# Altium footprint library 7-Connectors-9.PcbLib: 41 footprints (part 2 of 3) (continued)
## MOLEX_52991-0308 [mm] "0.50mm Pitch SlimStack?Dual Row 30 Circuits Surface Mount Vertical Receptacle (3.00 and 4.00mm Stacking Heights)" (continued)
3D body "MOLEX_52991-0308.stp": height 2.32, standoff 0, extent -5.65,-2.7 5.65,2.7

## MOLEX_53748-0308 [mm] "0.50mm Pitch SlimStack Dual Row 30 Circuits Surface Mount Vertical Plug (3.00mm Stacking Heights)"
height 2.4
pads (30):
  rect 0.25x1.2 smd: 1(-3.5,1.7) 2(-3.5,-1.7) 3(-3,1.7) 4(-3,-1.7) 5(-2.5,1.7) 6(-2.5,-1.7) 7(-2,1.7) 8(-2,-1.7) 9(-1.5,1.7) 10(-1.5,-1.7) 11(-1,1.7) 12(-1,-1.7) 13(-0.5,1.7) 14(-0.5,-1.7) 15(0,1.7) 16(0,-1.7) 17(0.5,1.7) 18(0.5,-1.7) 19(1,1.7) 20(1,-1.7) 21(1.5,1.7) 22(1.5,-1.7) 23(2,1.7) 24(2,-1.7) 25(2.5,1.7) 26(2.5,-1.7) 27(3,1.7) 28(3,-1.7) 29(3.5,1.7) 30(3.5,-1.7)
Top Overlay:
  circle w0.25: c-5.644,2.286 r0.125
  lines w0.2: -5.65,-1.55 -4.025,-1.55 ; -5.65,-1.2 -4.75,-1.2 -4.75,1.2 -5.65,1.2 ; -5.65,1.55 -4.025,1.55 ; -5.37,-0.75 -5.37,-1.12 ; -5.37,0.75 -5.37,1.12 ; -5.25,-0.75 -5.25,-1 ; -5.25,0.75 -5.25,1 ; -4.95,-0.75 -5.65,-0.75 -5.65,-2.15 -4.55,-2.15 -4.55,-1.55 ; -4.95,0.75 -5.65,0.75 -5.65,1.66 -4.95,2.15 -4.55,2.15 -4.55,1.55 ; -4.35,-1.36 -4.2,-1.21 ; -4.35,1.36 -4.2,1.21 ; -4.16,-1.55 -4.01,-1.4 cw(c-4.014,-1.214) -4.2,-1.21 ; -4.16,1.55 -4.01,1.4 ccw(c-4.014,1.214) -4.2,1.21 ; -4.15,-1.55 cw(c-4.15,-1.35) -4.35,-1.35 -4.35,1.35 cw(c-4.15,1.35) -4.15,1.55 ; -3.87,-0.7 -3.87,0.7 ; 3.87,-0.7 3.87,0.7 ; 4.025,-1.55 5.65,-1.55 ; 4.025,1.55 5.65,1.55 ; 4.15,-1.55 ccw(c4.15,-1.35) 4.35,-1.36 ; 4.16,-1.55 4.01,-1.4 ccw(c4.014,-1.214) 4.2,-1.21 ; 4.35,1.359 ccw(c4.15,1.35) 4.16,1.55 4.01,1.4 cw(c4.014,1.214) 4.2,1.21 ; 4.55,1.55 4.55,2.15 5.65,2.15 5.65,0.75 4.95,0.75 ; 4.552,-1.55 4.55,-2.15 5.65,-2.15 5.65,-0.75 4.95,-0.75 ; 5.25,-0.75 5.25,-1 ; 5.25,0.75 5.25,1 ; 5.37,-0.75 5.37,-1.12 ; 5.37,0.75 5.37,1.12 ; 5.65,-1.2 4.75,-1.2 4.75,1.2 5.65,1.2 ; -5.37,-1.12 -4.83,-1.12 ; -5.37,-1.12 -5.25,-1 ; -5.37,1.12 -4.83,1.12 ; -5.37,1.12 -5.25,1 ; -5.25,-1 -4.95,-1 ; -5.25,1 -4.95,1 ; -4.95,-1 -4.95,1 ; -4.95,-1 -4.83,-1.12 ; -4.95,1 -4.83,1.12 ; -4.83,-1.12 -4.83,1.12 ; -4.2,-1.21 -4.2,1.21 ; 4.2,-1.21 4.35,-1.36 ; 4.2,-1.21 4.2,1.21 ; 4.2,1.21 4.35,1.36 4.35,-1.36 ; 4.83,-1.12 4.95,-1 ; 4.83,-1.12 5.37,-1.12 ; 4.83,-1.12 4.83,1.12 ; 4.83,1.12 5.37,1.12 ; 4.83,1.12 4.95,1 ; 4.95,-1 4.95,1 ; 4.95,-1 5.25,-1 ; 4.95,1 5.25,1 ; 5.25,-1 5.37,-1.12 ; 5.25,1 5.37,1.12
Mechanical 8:
  drawing of 184 lines, arcs and shapes, not listed
Mechanical 14:
  drawing of 354 lines, arcs and shapes, not listed
Mechanical 15:
  lines w0.05: -5.9,-2.55 -5.9,2.55 5.9,2.55 5.9,-2.55 -5.9,-2.55
3D body "MOLEX_53748-0308.stp": height 2.42, standoff 0, extent -5.65,-2.15 5.65,2.15

## MOLEX_87832-1420 [mm] "Milli-Grid, Pitch 2mm, 14 contacts, Surface Mount Vertical Header With Locking Window And Centre Polarization Slot"
height 6.4
pads (16):
  rect 1x2.75 smd: 1(-6,-2.125) 2(-6,2.125) 3(-4,-2.125) 4(-4,2.125) 5(-2,-2.125) 6(-2,2.125) 7(0,-2.125) 8(0,2.125) 9(2,-2.125) 10(2,2.125) 11(4,-2.125) 12(4,2.125) 13(6,-2.125) 14(6,2.125)
  round 0.5 hole 1 unplated: 15(-5,0) 16(5,0)
Top Overlay:
  lines w0.2: -8.325,-1.5 -7.675,-1.5 ; -8.325,0.5 -7.675,0.5 ; -6.8,-3.15 -8.325,-3.15 ; -6.8,-2.5 -7.675,-2.5 ; -6.8,2.5 -7.675,2.5 ; -6.8,3.15 -8.325,3.15 ; 6.8,-3.15 8.325,-3.15 ; 6.8,-2.5 7.675,-2.5 ; 6.8,2.5 7.675,2.5 ; 6.8,3.15 8.325,3.15 ; 7.675,-0.5 8.325,-0.5 ; 7.675,1.5 8.325,1.5 ; -8.325,-3.15 -8.325,3.15 ; -8.325,-3.15 -7.675,-2.5 ; -8.325,3.15 -7.675,2.5 ; -7.675,-2.5 -7.675,2.5 ; 7.675,-2.5 8.325,-3.15 ; 7.675,-2.5 8.325,-3.15 ; 7.675,-2.5 7.675,2.5 ; 7.675,2.5 8.325,3.15 ; 7.675,2.5 8.325,3.15 ; 8.325,-3.15 8.325,3.15 ; -6.5,-4.25 -6,-3.75 -5.5,-4.25 -6.5,-4.25
Mechanical 14:
  lines w0.1: -8.325,-1.5 -7.675,-1.5 ; -8.325,0.5 -7.675,0.5 ; 7.675,-0.5 8.325,-0.5 ; 7.675,1.5 8.325,1.5 ; -8.325,-3.15 8.325,-3.15 ; -8.325,-3.15 -7.675,-2.5 ; -8.325,-3.15 -8.325,3.15 ; -8.325,3.15 8.325,3.15 ; -8.325,3.15 -7.675,2.5 ; -7.675,-2.5 -7.675,2.5 ; -7.675,-2.5 7.675,-2.5 ; -7.675,2.5 7.675,2.5 ; 7.675,-2.5 7.675,2.5 ; 7.675,-2.5 8.325,-3.15 ; 7.675,-2.5 8.325,-3.15 ; 7.675,2.5 8.325,3.15 ; 7.675,2.5 8.325,3.15 ; 8.325,-3.15 8.325,3.15 ; -6.5,-4.25 -5.5,-4.25 -6,-3.75 -6.5,-4.25
Mechanical 15:
  lines w0.05: -8.575,-3.765 -8.575,3.765 8.575,3.765 8.575,-3.765 -8.575,-3.765
3D body "MOLEX_87832-1420.stp": height 7.6, standoff -1, extent -8.325,-3.15 8.325,3.15

## MTGP720H320V6P [mm]
pads (1):
  round 7.2 hole 3.25: 1(0,0)
via 2.2,-1.35 diameter 1 hole 0.5
via 0,-2.625 diameter 1 hole 0.5
via 2.2,1.35 diameter 1 hole 0.5
via 0,2.525 diameter 1 hole 0.5
via -2.2,1.375 diameter 1 hole 0.5
via -2.2,-1.35 diameter 1 hole 0.5
Mechanical 8:
  circle w0.1: c0,0 r3.75
  circle w0.1: c0,0 r2.6
  lines w0.1: -2.657,1.625 -2.224,1.375 ; -2.632,-1.6 -2.199,-1.35 ; -2.474,0.942 -2.224,1.375 ; -2.449,-0.917 -2.199,-1.35 ; -1.974,1.808 -2.224,1.375 ; -1.949,-1.783 -2.199,-1.35 ; -1.791,1.125 -2.224,1.375 ; -1.766,-1.1 -2.199,-1.35 ; -0.5,-2.625 0,-2.625 ; -0.5,0 0,0 ; -0.5,2.525 0,2.525 ; 0,-3.125 0,-2.625 ; 0,-2.125 0,-2.625 ; 0,-0.5 0,0 ; 0,0.5 0,0 ; 0,2.025 0,2.525 ; 0,3.025 0,2.525 ; 0.5,-2.625 0,-2.625 ; 0.5,0 0,0 ; 0.5,2.525 0,2.525 ; 1.766,-1.1 2.199,-1.35 ; 1.766,1.1 2.199,1.35 ; 1.949,-1.783 2.199,-1.35 ; 1.949,1.783 2.199,1.35 ; 2.449,-0.917 2.199,-1.35 ; 2.449,0.917 2.199,1.35 ; 2.632,-1.6 2.199,-1.35 ; 2.632,1.6 2.199,1.35
Mechanical 14:
  circle w0.1: c0,0 r3.75
Mechanical 15:
  circle w0.05: c0,0 r3.85
3D body "mtgp720h320v6p.stp": height 0.1, standoff -1.75, extent -3.627,-3.627 3.628,3.628

## PANASONIC_AXN350038S [mm] "50 Contacts, Narrow-Pitch 0.8mm, Surface Mount, Straight Board Stacking Connector, Socket P8 Serie"
height 2.2
pads (52):
  rect 0.5x1.53 smd: 1(9.6,2.425) 2(9.6,-2.425) 3(8.8,2.425) 4(8.8,-2.425) 5(8,2.425) 6(8,-2.425) 7(7.2,2.425) 8(7.2,-2.425) 9(6.4,2.425) 10(6.4,-2.425) 11(5.6,2.425) 12(5.6,-2.425) 13(4.8,2.425) 14(4.8,-2.425) 15(4,2.425) 16(4,-2.425) 17(3.2,2.425) 18(3.2,-2.425) 19(2.4,2.425) 20(2.4,-2.425) 21(1.6,2.425) 22(1.6,-2.425) 23(0.8,2.425) 24(0.8,-2.425) 25(0,2.425) 26(0,-2.425) 27(-0.8,2.425) 28(-0.8,-2.425) 29(-1.6,2.425) 30(-1.6,-2.425) 31(-2.4,2.425) 32(-2.4,-2.425) 33(-3.2,2.425) 34(-3.2,-2.425) 35(-4,2.425) 36(-4,-2.425) 37(-4.8,2.425) 38(-4.8,-2.425) 39(-5.6,2.425) 40(-5.6,-2.425) 41(-6.4,2.425) 42(-6.4,-2.425) 43(-7.2,2.425) 44(-7.2,-2.425) 45(-8,2.425) 46(-8,-2.425) 47(-8.8,2.425) 48(-8.8,-2.425) 49(-9.6,2.425) 50(-9.6,-2.425)
  round 0.5 hole 0.9 unplated: 51(10.75,-1.95) 52(-10.75,-1.95)
Top Overlay:
  drawing of 237 lines, arcs and shapes, not listed
Mechanical 8:
  drawing of 414 lines, arcs and shapes, not listed
Mechanical 14:
  drawing of 244 lines, arcs and shapes, not listed
Mechanical 15:
  lines w0.05: -11.95,-3.44 -11.95,3.44 11.95,3.44 11.95,-3.44 -11.95,-3.44
3D body "PANASONIC_AXN350038S.stp": height 2.2, standoff -0.4, extent -11.7,-2.94 11.7,2.94

## PB [mm]
Top Overlay:
  circle w0.5: c-0.031,0.013 r2.5
  lines w0.5: -1.737,1.719 1.675,-1.693
  text "Pb" at -1.536,-0.948 h3.05
3D body "pb.stp": height 0.02, standoff 0, extent -2.725,-2.725 2.725,2.725

## PCI EXPRESS X1 [mm] "36 contacts Board Eddge PCI Express x1 Connector"
height 0.91
pads (36):
  rect 0.7x3.2 smd far side paste-0.4: A1(0.65,4)
  rect 0.7x4 smd far side paste-0.4: A2(1.65,3.6) A3(2.65,3.6) A4(3.65,3.6) A5(4.65,3.6) A6(5.65,3.6) A7(6.65,3.6) A8(7.65,3.6) A9(8.65,3.6) A10(9.65,3.6) A11(10.65,3.6) A12(13.65,3.6) A13(14.65,3.6) A14(15.65,3.6) A15(16.65,3.6) A16(17.65,3.6) A17(18.65,3.6) A18(19.65,3.6)
  rect 0.7x4 smd paste-0.4: B1(0.65,3.6) B2(1.65,3.6) B3(2.65,3.6) B4(3.65,3.6) B5(4.65,3.6) B6(5.65,3.6) B7(6.65,3.6) B8(7.65,3.6) B9(8.65,3.6) B10(9.65,3.6) B11(10.65,3.6) B12(13.65,3.6) B13(14.65,3.6) B14(15.65,3.6) B15(16.65,3.6) B16(17.65,3.6) B18(19.65,3.6)
  rect 0.7x3.2 smd paste-0.4: B17(18.65,4)
Top Overlay:
  text "B1" at 0.889,6.096 h0.76
  text "B11" at 10.889,6.096 h0.76
  text "B12" at 13.989,6.096 h0.76
  text "B18" at 19.989,6.096 h0.76
Bottom Overlay:
  text "A1" at 0.051,6.02 h0.76
  text "A11" at 10.051,6.02 h0.76
  text "A12" at 13.151,6.02 h0.76
  text "A18" at 19.151,6.02 h0.76
Mechanical 8:
  drawing of 164 lines, arcs and shapes, not listed

## PCI EXPRESS X4 [mm] "64 contacts Board Eddge PCI Express x4 Connector"
height 0.91
pads (64):
  rect 0.7x3.2 smd far side paste-0.4: A1(0.65,4)
  rect 0.7x4 smd far side paste-0.4: A2(1.65,3.6) A3(2.65,3.6) A4(3.65,3.6) A5(4.65,3.6) A6(5.65,3.6) A7(6.65,3.6) A8(7.65,3.6) A9(8.65,3.6) A10(9.65,3.6) A11(10.65,3.6) A12(13.65,3.6) A13(14.65,3.6) A14(15.65,3.6) A15(16.65,3.6) A16(17.65,3.6) A17(18.65,3.6) A18(19.65,3.6) A19(20.65,3.6) A20(21.65,3.6) A21(22.65,3.6) A22(23.65,3.601) A23(24.65,3.601) A24(25.65,3.601) A25(26.65,3.601) A26(27.65,3.601) A27(28.65,3.601) A28(29.65,3.601) A29(30.65,3.602) A30(31.65,3.602) A31(32.65,3.602) A32(33.65,3.602)
  rect 0.7x4 smd paste-0.4: B1(0.65,3.6) B2(1.65,3.6) B3(2.65,3.6) B4(3.65,3.6) B5(4.65,3.6) B6(5.65,3.6) B7(6.65,3.6) B8(7.65,3.6) B9(8.65,3.6) B10(9.65,3.6) B11(10.65,3.6) B12(13.65,3.6) B13(14.65,3.6) B14(15.65,3.6) B15(16.65,3.6) B16(17.65,3.6) B18(19.65,3.6) B19(20.65,3.6) B20(21.65,3.6) B21(22.65,3.6) B22(23.65,3.601) B23(24.65,3.601) B24(25.65,3.601) B25(26.65,3.601) B26(27.65,3.601) B27(28.65,3.601) B28(29.65,3.601) B29(30.65,3.602) B30(31.65,3.602) B32(33.65,3.602)
  rect 0.7x3.2 smd paste-0.4: B17(18.65,4) B31(32.65,4.002)
Top Overlay:
  text "B32" at 33.989,6.098 h0.76
  text "B18" at 19.989,6.096 h0.76
  text "B12" at 13.989,6.096 h0.76
  text "B11" at 10.889,6.096 h0.76
  text "B1" at 0.889,6.096 h0.76
Bottom Overlay:
  text "A32" at 33.151,6.022 h0.76
  text "A18" at 19.151,6.02 h0.76
  text "A12" at 13.151,6.02 h0.76
  text "A11" at 10.051,6.02 h0.76
  text "A1" at 0.051,6.02 h0.76
Mechanical 8:
  drawing of 280 lines, arcs and shapes, not listed

## PCI EXPRESS X8 [mm] "98 contacts Board Eddge PCI Express x8 Connector"
height 0.91
pads (98):
  rect 0.7x3.2 smd far side paste-0.4: A1(0.65,4)
  rect 0.7x4 smd far side paste-0.4: A2(1.65,3.6) A3(2.65,3.6) A4(3.65,3.6) A5(4.65,3.6) A6(5.65,3.6) A7(6.65,3.6) A8(7.65,3.6) A9(8.65,3.6) A10(9.65,3.6) A11(10.65,3.6) A12(13.65,3.6) A13(14.65,3.6) A14(15.65,3.6) A15(16.65,3.6) A16(17.65,3.6) A17(18.65,3.6) A18(19.65,3.6) A19(20.65,3.6) A20(21.65,3.6) A21(22.65,3.6) A22(23.65,3.601) A23(24.65,3.601) A24(25.65,3.601) A25(26.65,3.601) A26(27.65,3.601) A27(28.65,3.601) A28(29.65,3.601) A29(30.65,3.602) A30(31.65,3.602) A31(32.65,3.602) A32(33.65,3.602) A33(34.65,3.602) A34(35.65,3.602) A35(36.65,3.602) A36(37.65,3.602) A37(38.65,3.602) A38(39.65,3.602) A39(40.65,3.602) A40(41.65,3.602) A41(42.65,3.602) A42(43.65,3.602) A43(44.65,3.602) A44(45.65,3.602) A45(46.65,3.602) A46(47.65,3.602) A47(48.65,3.602) A48(49.65,3.602) A49(50.65,3.602)
  rect 0.7x4 smd paste-0.4: B1(0.65,3.6) B2(1.65,3.6) B3(2.65,3.6) B4(3.65,3.6) B5(4.65,3.6) B6(5.65,3.6) B7(6.65,3.6) B8(7.65,3.6) B9(8.65,3.6) B10(9.65,3.6) B11(10.65,3.6) B12(13.65,3.6) B13(14.65,3.6) B14(15.65,3.6) B15(16.65,3.6) B16(17.65,3.6) B18(19.65,3.6) B19(20.65,3.6) B20(21.65,3.6) B21(22.65,3.6) B22(23.65,3.601) B23(24.65,3.601) B24(25.65,3.601) B25(26.65,3.601) B26(27.65,3.601) B27(28.65,3.601) B28(29.65,3.601) B29(30.65,3.602) B30(31.65,3.602) B32(33.65,3.602) B33(34.65,3.602) B34(35.65,3.602) B35(36.65,3.602) B36(37.65,3.602) B37(38.65,3.602) B38(39.65,3.602) B39(40.65,3.602) B40(41.65,3.602) B41(42.65,3.602) B42(43.65,3.602) B43(44.65,3.602) B44(45.65,3.602) B45(46.65,3.602) B46(47.65,3.602) B47(48.65,3.602) B49(50.65,3.602)
  rect 0.7x3.2 smd paste-0.4: B17(18.65,4) B31(32.65,4.002) B48(49.65,4.002)
Top Overlay:
  text "B1" at 0.889,6.096 h0.76
  text "B11" at 10.889,6.096 h0.76
  text "B12" at 13.989,6.096 h0.76
  text "B18" at 19.989,6.096 h0.76
  text "B32" at 33.989,6.098 h0.76
  text "B49" at 50.989,6.098 h0.76
Bottom Overlay:
  text "A1" at 0.051,6.02 h0.76
  text "A11" at 10.051,6.02 h0.76
  text "A12" at 13.151,6.02 h0.76
  text "A18" at 19.151,6.02 h0.76
  text "A32" at 33.151,6.022 h0.76
  text "A49" at 50.151,6.022 h0.76
Mechanical 8:
  drawing of 308 lines, arcs and shapes, not listed

## PCI EXPRESS X16 [mm] "164 contacts Board Eddge PCI Express x16 Connector"
height 0.91
pads (164):
  rect 0.7x3.2 smd far side paste-0.4: A1(0.65,4)
  rect 0.7x4 smd far side paste-0.4: A2(1.65,3.6) A3(2.65,3.6) A4(3.65,3.6) A5(4.65,3.6) A6(5.65,3.6) A7(6.65,3.6) A8(7.65,3.6) A9(8.65,3.6) A10(9.65,3.6) A11(10.65,3.6) A12(13.65,3.6) A13(14.65,3.6) A14(15.65,3.6) A15(16.65,3.6) A16(17.65,3.6) A17(18.65,3.6) A18(19.65,3.6) A19(20.65,3.6) A20(21.65,3.6) A21(22.65,3.6) A22(23.65,3.601) A23(24.65,3.601) A24(25.65,3.601) A25(26.65,3.601) A26(27.65,3.601) A27(28.65,3.601) A28(29.65,3.601) A29(30.65,3.602) A30(31.65,3.602) A31(32.65,3.602) A32(33.65,3.602) A33(34.65,3.602) A34(35.65,3.602) A35(36.65,3.602) A36(37.65,3.602) A37(38.65,3.602) A38(39.65,3.602) A39(40.65,3.602) A40(41.65,3.602) A41(42.65,3.602) A42(43.65,3.602) A43(44.65,3.602) A44(45.65,3.602) A45(46.65,3.602) A46(47.65,3.602) A47(48.65,3.602) A48(49.65,3.602) A49(50.65,3.602) A50(51.65,3.602) A51(52.65,3.602) A52(53.65,3.602) A53(54.65,3.602) A54(55.65,3.602) A55(56.65,3.602) A56(57.65,3.602) A57(58.65,3.602) A58(59.65,3.602) A59(60.65,3.602) A60(61.65,3.602) A61(62.65,3.602) A62(63.65,3.602) A63(64.65,3.602) A64(65.65,3.602) A65(66.65,3.602) A66(67.65,3.602) A67(68.65,3.602) A68(69.65,3.602) A69(70.65,3.602) A70(71.65,3.602) A71(72.65,3.602) A72(73.65,3.602) A73(74.65,3.602) A74(75.65,3.602) A75(76.65,3.602) A76(77.65,3.602) A77(78.65,3.602) A78(79.65,3.602) A79(80.65,3.602) A80(81.65,3.602) A81(82.65,3.602) A82(83.65,3.602)
  rect 0.7x4 smd paste-0.4: B1(0.65,3.6) B2(1.65,3.6) B3(2.65,3.6) B4(3.65,3.6) B5(4.65,3.6) B6(5.65,3.6) B7(6.65,3.6) B8(7.65,3.6) B9(8.65,3.6) B10(9.65,3.6) B11(10.65,3.6) B12(13.65,3.6) B13(14.65,3.6) B14(15.65,3.6) B15(16.65,3.6) B16(17.65,3.6) B18(19.65,3.6) B19(20.65,3.6) B20(21.65,3.6) B21(22.65,3.6) B22(23.65,3.601) B23(24.65,3.601) B24(25.65,3.601) B25(26.65,3.601) B26(27.65,3.601) B27(28.65,3.601) B28(29.65,3.601) B29(30.65,3.602) B30(31.65,3.602) B32(33.65,3.602) B33(34.65,3.602) B34(35.65,3.602) B35(36.65,3.602) B36(37.65,3.602) B37(38.65,3.602) B38(39.65,3.602) B39(40.65,3.602) B40(41.65,3.602) B41(42.65,3.602) B42(43.65,3.602) B43(44.65,3.602) B44(45.65,3.602) B45(46.65,3.602) B46(47.65,3.602) B47(48.65,3.602) B49(50.65,3.602) B50(51.65,3.602) B51(52.65,3.602) B52(53.65,3.602) B53(54.65,3.602) B54(55.65,3.602) B55(56.65,3.602) B56(57.65,3.602) B57(58.65,3.602) B58(59.65,3.602) B59(60.65,3.602) B60(61.65,3.602) B61(62.65,3.602) B62(63.65,3.602) B63(64.65,3.602) B64(65.65,3.602) B65(66.65,3.602) B66(67.65,3.602) B67(68.65,3.602) B68(69.65,3.602) B69(70.65,3.602) B70(71.65,3.602) B71(72.65,3.602) B72(73.65,3.602) B73(74.65,3.602) B74(75.65,3.602) B75(76.65,3.602) B76(77.65,3.602) B77(78.65,3.602) B78(79.65,3.602) B79(80.65,3.602) B80(81.65,3.602) B82(83.65,3.602)
  rect 0.7x3.2 smd paste-0.4: B17(18.65,4) B31(32.65,4.002) B48(49.65,4.002) B81(82.65,4.002)
Top Overlay:
  text "B1" at 0.889,6.096 h0.76
  text "B11" at 10.889,6.096 h0.76
  text "B12" at 13.989,6.096 h0.76
  text "B18" at 19.989,6.096 h0.76
  text "B32" at 33.989,6.098 h0.76
  text "B49" at 50.989,6.098 h0.76
  text "B82" at 83.989,6.098 h0.76
Bottom Overlay:
  text "A1" at 0.051,6.02 h0.76
  text "A11" at 10.051,6.02 h0.76
  text "A12" at 13.151,6.02 h0.76
  text "A18" at 19.151,6.02 h0.76
  text "A32" at 33.151,6.022 h0.76
  text "A49" at 50.151,6.022 h0.76
  text "A82" at 83.151,6.022 h0.76
Mechanical 8:
  drawing of 328 lines, arcs and shapes, not listed

## PIC-SMT-4 [mm]
height 16.45
pads (6):
  rect 0.5x1.6 smd mask+0.051: 1(1.778,1.168) 2(0.508,1.168)
  rect 0.5x1.6 smd mask+0: 3(-0.635,1.168) 4(-1.905,1.168)
  rect 2x2 smd mask+0: 5(-4.445,-1.168) 6(4.445,-1.168)
Top Overlay:
  lines w0.254: -5.029,-2.413 -5.029,0.787 -4.75,0.787 4.826,0.787 4.826,-2.413 -5.029,-2.413
3D body "pic-smt-4.stp": height 2.6, standoff 0, extent -4.925,-2.54 4.875,1.46

## SAMTEC_CLM-107-02-L-D-PA-TR [mm] "14 Contacts - Pitch 1mm - Dual Row Surface Mount Straight Strip Header With Integral Alignment Pin"
height 2.26
pads (16):
  rect 0.61x1.37 smd: 1(-3,1.6) 2(-3,-1.6) 3(-2,1.6) 4(-2,-1.6) 5(-1,1.6) 6(-1,-1.6) 7(0,1.6) 8(0,-1.6) 9(1,1.6) 10(1,-1.6) 11(2,1.6) 12(2,-1.6) 13(3,1.6) 14(3,-1.6)
  round 0.5 hole 1 unplated mask+0.25: POS1(0,3.495) POS2(0,-3.495)
Top Layer keep-out:
  circle w0.1: c0,-3.495 r0.75
  circle w0.1: c0,3.495 r0.75
Top Overlay:
  circle w0.25: c-2.952,2.985 r0.125
  circle w0.25: c-2.952,2.985 r0.125
  lines w0.1: -3.659,-1.27 -3.659,1.27 ; 3.659,-1.27 3.659,1.27
Mechanical 8:
  circle w0.1: c0,3.495 r0.5
  circle w0.1: c0,-3.495 r0.5
  lines w0.1: -3.5,-1.6 -3,-1.6 ; -3.5,1.6 -3,1.6 ; -3,-2.1 -3,-1.6 ; -3,-1.1 -3,-1.6 ; -3,1.1 -3,1.6 ; -3,2.1 -3,1.6 ; -2.5,-1.6 -2,-1.6 ; -2.5,1.6 -2,1.6 ; -2,-2.1 -2,-1.6 ; -2,-1.1 -2,-1.6 ; -2,1.1 -2,1.6 ; -2,2.1 -2,1.6 ; -1.5,-1.6 -1,-1.6 ; -1.5,1.6 -1,1.6 ; -1,-2.1 -1,-1.6 ; -1,-1.1 -1,-1.6 ; -1,1.1 -1,1.6 ; -1,2.1 -1,1.6 ; -0.5,-3.495 0,-3.495 ; -0.5,-1.6 0,-1.6 ; -0.5,0 0,0 ; -0.5,1.6 0,1.6 ; -0.5,3.495 0,3.495 ; 0,-3.995 0,-3.495 ; 0,-2.995 0,-3.495 ; 0,-2.1 0,-1.6 ; 0,-1.1 0,-1.6 ; 0,-0.5 0,0 ; 0,0.5 0,0 ; 0,1.1 0,1.6 ; 0,2.1 0,1.6 ; 0,2.995 0,3.495 ; 0,3.995 0,3.495 ; 0.5,-3.495 0,-3.495 ; 0.5,-1.6 1,-1.6 ; 0.5,0 0,0 ; 0.5,1.6 1,1.6 ; 0.5,3.495 0,3.495 ; 1,-2.1 1,-1.6 ; 1,-1.1 1,-1.6 ; 1,1.1 1,1.6 ; 1,2.1 1,1.6 ; 1.5,-1.6 2,-1.6 ; 1.5,1.6 2,1.6 ; 2,-2.1 2,-1.6 ; 2,-1.1 2,-1.6 ; 2,1.1 2,1.6 ; 2,2.1 2,1.6 ; 2.5,-1.6 3,-1.6 ; 2.5,1.6 3,1.6 ; 3,-2.1 3,-1.6 ; 3,-1.1 3,-1.6 ; 3,1.1 3,1.6 ; 3,2.1 3,1.6 ; -3.305,-2.285 -2.695,-2.285 -2.695,-0.915 -3.305,-0.915 -3.305,-2.285 ; -3.305,0.915 -2.695,0.915 -2.695,2.285 -3.305,2.285 -3.305,0.915 ; -2.305,-2.285 -1.695,-2.285 -1.695,-0.915 -2.305,-0.915 -2.305,-2.285 ; -2.305,0.915 -1.695,0.915 -1.695,2.285 -2.305,2.285 -2.305,0.915 ; -1.305,-2.285 -0.695,-2.285 -0.695,-0.915 -1.305,-0.915 -1.305,-2.285 ; -1.305,0.915 -0.695,0.915 -0.695,2.285 -1.305,2.285 -1.305,0.915 ; -0.305,-2.285 0.305,-2.285 0.305,-0.915 -0.305,-0.915 -0.305,-2.285 ; -0.305,0.915 0.305,0.915 0.305,2.285 -0.305,2.285 -0.305,0.915 ; 0.695,-2.285 1.305,-2.285 1.305,-0.915 0.695,-0.915 0.695,-2.285 ; 0.695,0.915 1.305,0.915 1.305,2.285 0.695,2.285 0.695,0.915 ; 1.695,-2.285 2.305,-2.285 2.305,-0.915 1.695,-0.915 1.695,-2.285 ; 1.695,0.915 2.305,0.915 2.305,2.285 1.695,2.285 1.695,0.915 ; 2.695,-2.285 3.305,-2.285 3.305,-0.915 2.695,-0.915 2.695,-2.285 ; 2.695,0.915 3.305,0.915 3.305,2.285 2.695,2.285 2.695,0.915
Mechanical 14:
  drawing of 217 lines, arcs and shapes, not listed
Mechanical 15:
  lines w0.1: -3.909,-2.535 -2.028,-2.535 -2.028,-4.378 2.028,-4.378 2.028,-2.535 3.909,-2.535 3.909,2.535 2.028,2.535 2.028,4.378 -2.028,4.378 -2.028,2.535 -3.909,2.535 -3.909,-2.535
3D body "SAMTEC_CLM-107-02-L-D-PA-TR_Part1.stp": height 2.25, standoff 0, extent -3.659,-1.905 3.659,1.905
3D body "SAMTEC_CLM-107-02-L-D-PA-TR_Part2.stp": height 3.01, standoff -1.36, extent -1.778,-4.127 1.778,4.128

## SAMTEC_MEC6-140-02-L-D-RA1 [mm] "80 Contacts, Pitch 0.635mm, Right Angle Micro Edge Card Socket"
height 5.78
pads (82):
  rect 0.4x2 smd mask+0: 1(-12.382,-4) 2(-12.382,4) 3(-11.747,-4) 4(-11.747,4) 5(-11.112,-4) 6(-11.112,4) 7(-10.477,-4) 8(-10.477,4) 9(-9.842,-4) 10(-9.842,4) 11(-9.207,-4) 12(-9.207,4) 13(-8.572,-4) 14(-8.572,4) 15(-7.937,-4) 16(-7.937,4) 17(-7.302,-4) 18(-7.302,4) 19(-6.667,-4) 20(-6.667,4) 21(-6.032,-4) 22(-6.032,4) 23(-5.397,-4) 24(-5.397,4) 25(-4.762,-4) 26(-4.762,4) 27(-4.127,-4) 28(-4.127,4) 29(-3.492,-4) 30(-3.492,4) 31(-2.857,-4) 32(-2.857,4) 33(-2.222,-4) 34(-2.222,4) 35(-1.587,-4) 36(-1.587,4) 37(-0.952,-4) 38(-0.952,4) 39(-0.317,-4) 40(-0.317,4) 41(0.318,-4) 42(0.318,4) 43(0.953,-4) 44(0.953,4) 45(1.588,-4) 46(1.588,4) 47(2.223,-4) 48(2.223,4) 49(2.858,-4) 50(2.858,4) 51(3.493,-4) 52(3.493,4) 53(4.128,-4) 54(4.128,4) 55(4.763,-4) 56(4.763,4) 57(5.398,-4) 58(5.398,4) 59(6.033,-4) 60(6.033,4) 61(6.668,-4) 62(6.668,4) 63(7.303,-4) 64(7.303,4) 65(7.938,-4) 66(7.938,4) 67(8.573,-4) 68(8.573,4) 69(9.208,-4) 70(9.208,4) 71(9.843,-4) 72(9.843,4) 73(10.478,-4) 74(10.478,4) 75(11.113,-4) 76(11.113,4) 77(11.748,-4) 78(11.748,4) 79(12.383,-4) 80(12.383,4)
  round 1 hole 1.55 unplated mask+0.275: 81(-13.582,0) 82(13.583,0)
Top Overlay:
  lines w0.2: -14.282,-0.816 -14.282,-3.7 -12.982,-3.7 ; -14.282,0.816 -14.282,2.5 -13.082,3.7 -12.982,3.7 ; 12.925,-2.65 13.733,-2.65 ; 12.925,-0.87 12.925,-3.2 14.208,-3.2 13.733,-2.725 13.733,-1.06 ; 12.925,0.87 12.925,3.023 14.283,1.666 ; 12.983,-3.7 14.283,-3.7 14.283,-0.792 ; 12.983,3.7 13.083,3.7 14.283,2.5 14.283,0.792 ; 13.733,1.06 13.733,2.216
Mechanical 8:
  lines w0.1: -14.082,0 -13.582,0 ; -13.582,-0.5 -13.582,0 ; -13.582,0.5 -13.582,0 ; -13.082,0 -13.582,0 ; -0.5,0 0,0 ; 0,-0.5 0,0 ; 0,0.5 0,0 ; 0.5,0 0,0 ; 13.083,0 13.583,0 ; 13.583,-0.5 13.583,0 ; 13.583,0.5 13.583,0 ; 14.083,0 13.583,0 ; -12.582,-5 -12.182,-5 ; -12.582,-5 -12.582,-3 -12.182,-3 -12.182,-5 ; -12.582,-5 -12.382,-4 -12.182,-5 ; -12.582,5 -12.182,5 ; -12.582,5 -12.582,3 -12.182,3 -12.182,5 ; -12.582,5 -12.382,4 -12.182,5 ; -11.947,-5 -11.547,-5 ; -11.947,-5 -11.947,-3 -11.547,-3 -11.547,-5 ; -11.947,-5 -11.747,-4 -11.547,-5 ; -11.947,5 -11.547,5 ; -11.947,5 -11.947,3 -11.547,3 -11.547,5 ; -11.947,5 -11.747,4 -11.547,5 ; 11.548,-5 11.948,-5 ; 11.548,-5 11.548,-3 11.948,-3 11.948,-5 ; 11.548,-5 11.748,-4 11.948,-5 ; 11.548,5 11.948,5 ; 11.548,5 11.548,3 11.948,3 11.948,5 ; 11.548,5 11.748,4 11.948,5 ; 12.183,-5 12.583,-5 ; 12.183,-5 12.183,-3 12.583,-3 12.583,-5 ; 12.183,-5 12.383,-4 12.583,-5 ; 12.183,5 12.583,5 ; 12.183,5 12.183,3 12.583,3 12.583,5 ; 12.183,5 12.383,4 12.583,5
Mechanical 14:
  lines w0.1: -14.282,-3.7 -14.282,2.5 -13.082,3.7 13.083,3.7 14.283,2.5 14.283,-3.7 -14.282,-3.7
Mechanical 15:
  lines w0.05: -14.532,-5.25 -14.532,5.25 14.533,5.25 14.533,-5.25 -14.532,-5.25
3D body "SAMTEC_MEC6-140-02-L-D-RA1.stp": height 5.77, standoff -1.05, extent -14.282,-4.55 14.283,4.55